# Altium footprint library FCI THD.PcbLib: 30 footprints (part 1 of 2)
Each footprint in its own frame and in the unit in brackets; x right, y up, seen from the top. Pads: shape width x height; smd on the part's side, far side on the other; paste and mask are expansions set on the pad; w line width, h text height; cw(c..) or ccw(c..) is an arc to the next point about the centre after c.
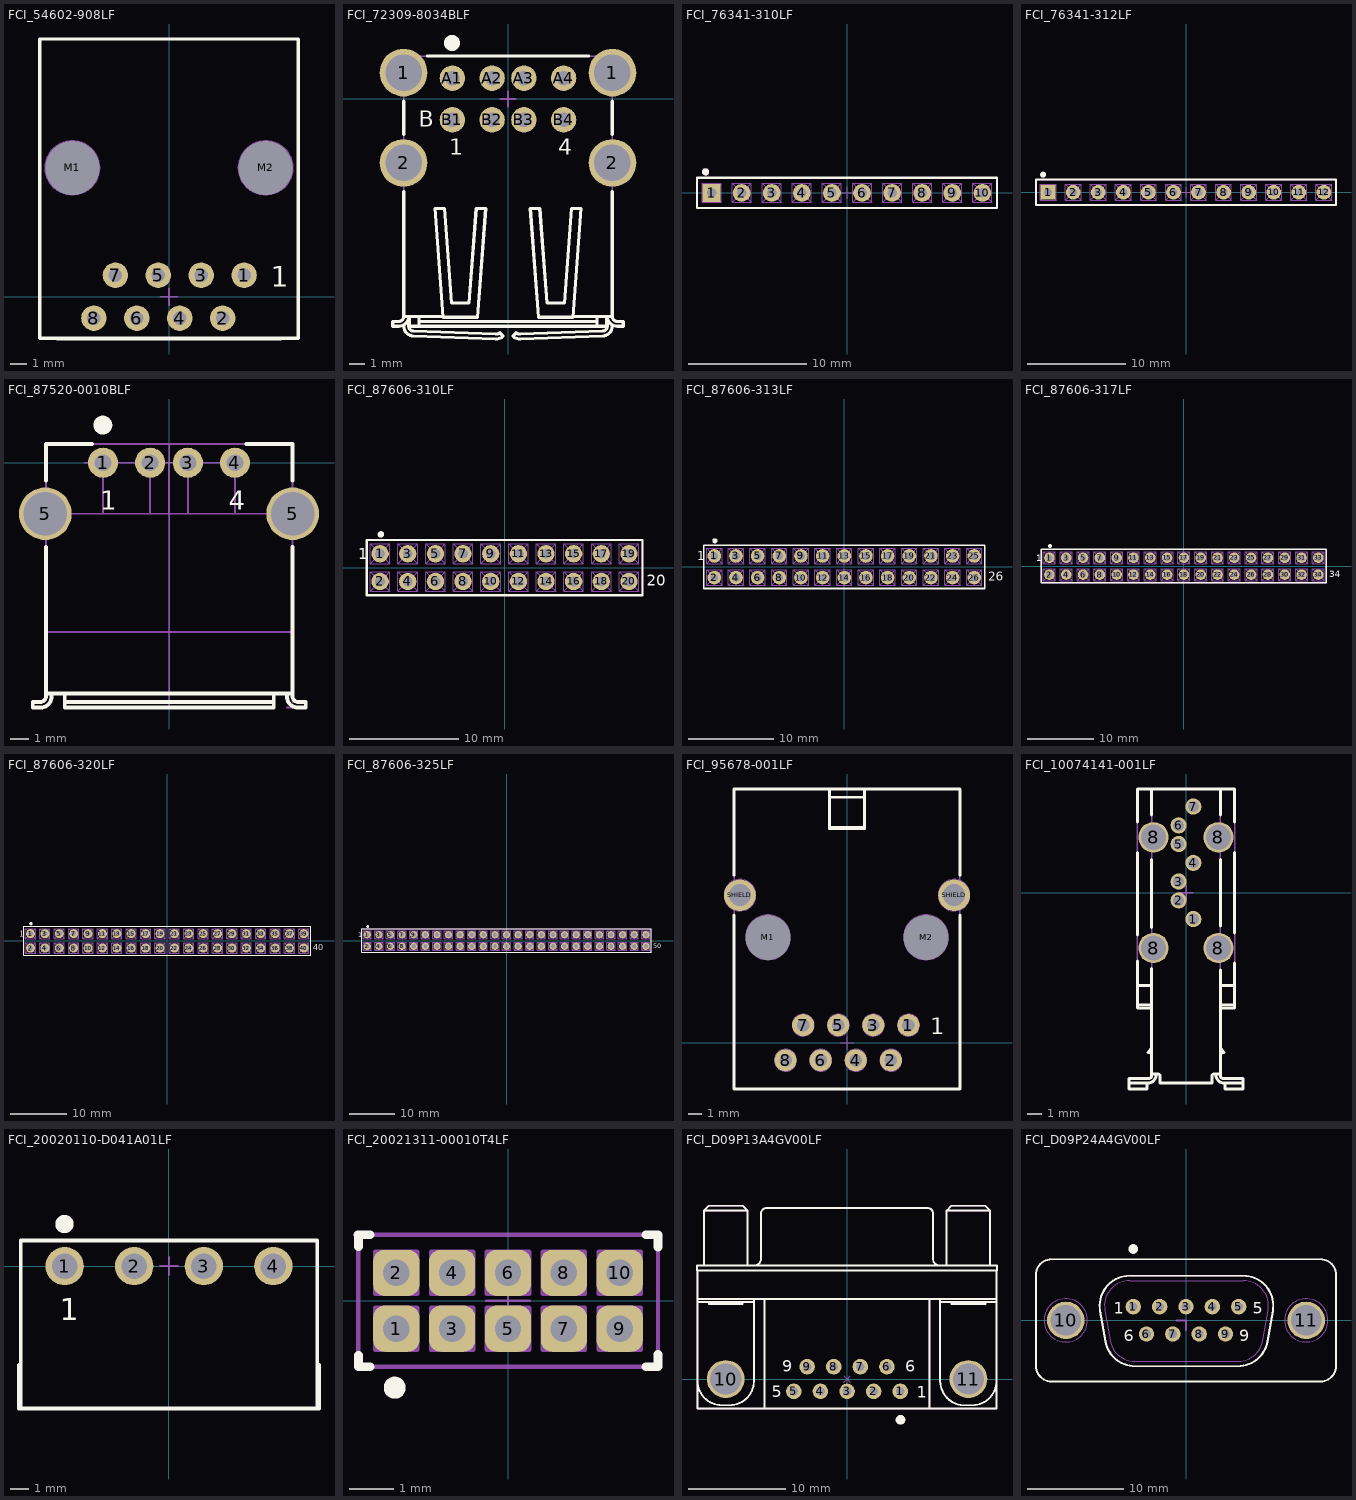
[diagram p0: the footprints below, top view; thin cyan lines are the x and y axes]

## FCI_54602-908LF [mm] "1 Port, 8 Positions, CAT3 RJ45 Horizontal Modular Jack"
height 10
pads (10):
  round 1.5 hole 0.8: 1(4.445,1.27) 2(3.175,-1.27) 3(1.905,1.27) 4(0.635,-1.27) 5(-0.635,1.27) 6(-1.905,-1.27) 7(-3.171,1.27) 8(-4.445,-1.27)
  round 1 hole 3.2 unplated mask+1.1: M1(-5.715,7.62) M2(5.715,7.62)
Top Overlay:
  lines w0.2: -6.6,-2.46 -6.6,-2.5 6.6,-2.5 6.6,-2.46 ; -7.65,-2.46 7.65,-2.46 7.65,15.24 -7.65,15.24 -7.65,-2.46
  text "1" at 6.03,0.6 h1.2
Mechanical 8:
  circle w0.1: c5.715,7.62 r1.6
  circle w0.1: c-5.715,7.62 r1.6
  circle w0.1: c4.445,1.27 r0.415
  circle w0.1: c-3.175,1.27 r0.415
  circle w0.1: c-4.445,-1.27 r0.415
  circle w0.1: c3.175,-1.27 r0.415
  lines w0.1: -6.215,7.62 -5.715,7.62 ; -5.715,7.12 -5.715,7.62 ; -5.715,8.12 -5.715,7.62 ; -5.215,7.62 -5.715,7.62 ; -4.945,-1.27 -4.445,-1.27 ; -4.445,-1.77 -4.445,-1.27 ; -4.445,-0.77 -4.445,-1.27 ; -3.945,-1.27 -4.445,-1.27 ; -3.675,1.27 -3.175,1.27 ; -3.175,0.77 -3.175,1.27 ; -3.175,1.77 -3.175,1.27 ; -2.675,1.27 -3.175,1.27 ; -2.405,-1.27 -1.905,-1.27 ; -1.905,-1.77 -1.905,-1.27 ; -1.905,-0.77 -1.905,-1.27 ; -1.405,-1.27 -1.905,-1.27 ; -1.135,1.27 -0.635,1.27 ; -0.635,0.77 -0.635,1.27 ; -0.635,1.77 -0.635,1.27 ; -0.5,0 0,0 ; -0.135,1.27 -0.635,1.27 ; 0,-0.5 0,0 ; 0,0.5 0,0 ; 0.135,-1.27 0.635,-1.27 ; 0.5,0 0,0 ; 0.635,-1.77 0.635,-1.27 ; 0.635,-0.77 0.635,-1.27 ; 1.135,-1.27 0.635,-1.27 ; 1.405,1.27 1.905,1.27 ; 1.905,0.77 1.905,1.27 ; 1.905,1.77 1.905,1.27 ; 2.405,1.27 1.905,1.27 ; 2.675,-1.27 3.175,-1.27 ; 3.175,-1.77 3.175,-1.27 ; 3.175,-0.77 3.175,-1.27 ; 3.675,-1.27 3.175,-1.27 ; 3.945,1.27 4.445,1.27 ; 4.445,0.77 4.445,1.27 ; 4.445,1.77 4.445,1.27 ; 4.945,1.27 4.445,1.27 ; 5.215,7.62 5.715,7.62 ; 5.715,7.12 5.715,7.62 ; 5.715,8.12 5.715,7.62 ; 6.215,7.62 5.715,7.62
Mechanical 14:
  lines w0.1: -6.6,-2.46 -6.6,-2.5 6.6,-2.5 6.6,-2.46 ; -7.65,-2.46 7.65,-2.46 7.65,15.24 -7.65,15.24 -7.65,-2.46
  text "1" at 6.03,0.6 h1.2
3D body "FCI_54602-908LF.stp": height 12.7, standoff -3.5, extent -7.65,-2.5 7.65,15.24

## FCI_72309-8034BLF [mm] "Dual USB Type A 4 Pin Receptacle, Right Angle, Shielded"
height 15.5
pads (12):
  round 3 hole 2.3: 1(-6.57,1.66) 1(6.57,1.66) 2(-6.57,-4.02) 2(6.57,-4.02)
  round 1.6 hole 0.9: A1(-3.5,1.31) A2(-1,1.31) A3(1,1.31) A4(3.5,1.31) B1(-3.5,-1.31) B2(-1,-1.31) B3(1,-1.31) B4(3.5,-1.31)
Top Overlay:
  circle w0.5: c-3.525,3.525 r0.25
  lines w0.2: -6.555,-14.214 -6.555,-14.3 ccw(c-5.95,-14.3) -5.973,-14.905 -0.78,-15.1 ccw(c-0.755,-14.433) -0.305,-14.925 -0.511,-14.7 cw(c-0.755,-14.433) -0.769,-14.795 -5.961,-14.6 cw(c-5.95,-14.3) -6.25,-14.3 -6.25,-13.68 cw(c-6.87,-13.68) -6.87,-14.3 -7.25,-14.301 -7.25,-13.995 -6.87,-13.995 ccw(c-6.87,-13.68) -6.555,-13.68 ; -6.555,-5.82 -6.555,-13.68 ; -6.555,-2.22 -6.555,-0.14 ; -6.2,-13.68 -6.2,-14.3 6.2,-14.3 6.2,-13.68 ; -5.6,-14.3 -5.6,-13.68 ; -5.6,-13.995 5.6,-13.995 ; -5.102,2.701 5.086,2.7 ; -4.094,-13.68 -6.555,-13.68 ; -4.085,-13.724 -4.602,-6.88 -4,-6.88 -3.55,-12.84 -2.45,-12.84 -2,-6.88 -1.398,-6.88 -1.915,-13.73 -4.085,-13.73 ; 0.755,-14.795 5.961,-14.6 ccw(c5.95,-14.3) 6.25,-14.3 6.25,-13.68 ccw(c6.87,-13.68) 6.87,-14.3 7.25,-14.3 7.25,-13.995 6.87,-13.995 cw(c6.87,-13.68) 6.555,-13.68 ; 0.769,-14.795 cw(c0.755,-14.433) 0.511,-14.7 0.305,-14.925 ccw(c0.755,-14.433) 0.78,-15.1 5.973,-14.905 ccw(c5.95,-14.3) 6.555,-14.3 6.555,-14.214 ; 1.915,-13.73 4.085,-13.73 4.602,-6.88 4,-6.88 3.55,-12.84 2.45,-12.84 2,-6.88 1.398,-6.88 1.915,-13.724 ; 4.088,-13.68 6.555,-13.68 ; 5.6,-14.3 5.6,-13.68 ; 6.555,-5.82 6.555,-13.68 ; 6.555,-2.22 6.555,-0.14
  text "4" at 3.148,-3.5 h1
  text "1" at -3.685,-3.5 h1
  text "B" at -5.613,-1.75 h1
Mechanical 8:
  lines w0.1: -7.07,-4.02 -6.57,-4.02 ; -7.07,1.66 -6.57,1.66 ; -6.57,-4.52 -6.57,-4.02 ; -6.57,-3.52 -6.57,-4.02 ; -6.57,1.16 -6.57,1.66 ; -6.57,2.16 -6.57,1.66 ; -6.07,-4.02 -6.57,-4.02 ; -6.07,1.66 -6.57,1.66 ; -4,-1.31 -3.5,-1.31 ; -4,1.31 -3.5,1.31 ; -3.5,-1.81 -3.5,-1.31 ; -3.5,-0.81 -3.5,-1.31 ; -3.5,0.81 -3.5,1.31 ; -3.5,1.81 -3.5,1.31 ; -3,-1.31 -3.5,-1.31 ; -3,1.31 -3.5,1.31 ; -1.5,-1.31 -1,-1.31 ; -1.5,1.31 -1,1.31 ; -1,-1.81 -1,-1.31 ; -1,-0.81 -1,-1.31 ; -1,0.81 -1,1.31 ; -1,1.81 -1,1.31 ; -0.5,-1.31 -1,-1.31 ; -0.5,0 0,0 ; -0.5,1.31 -1,1.31 ; 0,-0.5 0,0 ; 0,0.5 0,0 ; 0.5,-1.31 1,-1.31 ; 0.5,0 0,0 ; 0.5,1.31 1,1.31 ; 1,-1.81 1,-1.31 ; 1,-0.81 1,-1.31 ; 1,0.81 1,1.31 ; 1,1.81 1,1.31 ; 1.5,-1.31 1,-1.31 ; 1.5,1.31 1,1.31 ; 3,-1.31 3.5,-1.31 ; 3,1.31 3.5,1.31 ; 3.5,-1.81 3.5,-1.31 ; 3.5,-0.81 3.5,-1.31 ; 3.5,0.81 3.5,1.31 ; 3.5,1.81 3.5,1.31 ; 4,-1.31 3.5,-1.31 ; 4,1.31 3.5,1.31 ; 6.07,-4.02 6.57,-4.02 ; 6.07,1.66 6.57,1.66 ; 6.57,-4.52 6.57,-4.02 ; 6.57,-3.52 6.57,-4.02 ; 6.57,1.16 6.57,1.66 ; 6.57,2.16 6.57,1.66 ; 7.07,-4.02 6.57,-4.02 ; 7.07,1.66 6.57,1.66
Mechanical 14:
  lines w0.1: -6.555,-14.214 -6.555,-14.3 ccw(c-5.95,-14.3) -5.973,-14.905 -0.78,-15.1 ccw(c-0.755,-14.433) -0.305,-14.925 -0.511,-14.7 cw(c-0.755,-14.433) -0.769,-14.795 -5.961,-14.6 cw(c-5.95,-14.3) -6.25,-14.3 -6.25,-13.68 cw(c-6.87,-13.68) -6.87,-14.3 -7.25,-14.301 -7.25,-13.995 -6.87,-13.995 ccw(c-6.87,-13.68) -6.555,-13.68 ; -6.555,1 -7.5,1 -7.5,2 -6.555,2 ; -6.555,2.701 6.555,2.7 ; -6.25,2.7 -6.25,2.918 -6.555,2.918 -6.555,-13.68 ; -6.2,-13.68 -6.2,-14.3 6.2,-14.3 6.2,-13.68 ; -5.6,-14.3 -5.6,-13.68 ; -5.6,-13.995 5.6,-13.995 ; -4.094,-13.68 -6.555,-13.68 ; -4.085,-13.724 -4.602,-6.88 -4,-6.88 -3.55,-12.84 -2.45,-12.84 -2,-6.88 -1.398,-6.88 -1.915,-13.73 -4.085,-13.73 ; 0.755,-14.795 5.961,-14.6 ccw(c5.95,-14.3) 6.25,-14.3 6.25,-13.68 ccw(c6.87,-13.68) 6.87,-14.3 7.25,-14.3 7.25,-13.995 6.87,-13.995 cw(c6.87,-13.68) 6.555,-13.68 ; 0.769,-14.795 cw(c0.755,-14.433) 0.511,-14.7 0.305,-14.925 ccw(c0.755,-14.433) 0.78,-15.1 5.973,-14.905 ccw(c5.95,-14.3) 6.555,-14.3 6.555,-14.214 ; 1.915,-13.73 4.085,-13.73 4.602,-6.88 4,-6.88 3.55,-12.84 2.45,-12.84 2,-6.88 1.398,-6.88 1.915,-13.724 ; 4.088,-13.68 6.555,-13.68 ; 5.6,-14.3 5.6,-13.68 ; 6.25,2.7 6.25,2.918 6.555,2.918 6.555,-13.68 ; 6.555,1 7.5,1 7.5,2 6.555,2
  text "4" at 3.148,-3.5 h1
  text "1" at -3.685,-3.5 h1
  text "B" at -5.613,-1.75 h1
3D body "FCI_72309-8034BLF.stp": height 16.19, standoff -2.8, extent -7.5,-15.099 7.5,2.918

## FCI_76341-310LF [mm] "2.54mm (.100\") Pitch, 10 Circuits  Single Row  Top Entry Through Mount Receptacle"
height 7
pads (10):
  rect 1.5x1.5 hole 0.8: 1(-11.43,0)
  round 1.5 hole 0.8: 2(-8.89,0) 3(-6.35,0) 4(-3.81,0) 5(-1.27,0) 6(1.27,0) 7(3.81,0) 8(6.35,0) 9(8.89,0) 10(11.43,0)
Top Overlay:
  circle w0.3: c-11.938,1.778 r0.15
  lines w0.2: -12.66,-1.27 12.66,-1.27 12.66,1.27 -12.66,1.27 -12.66,-1.27
Mechanical 8:
  lines w0.1: -11.93,0 -11.43,0 ; -11.43,-0.5 -11.43,0 ; -11.43,0.5 -11.43,0 ; -10.93,0 -11.43,0 ; -9.39,0 -8.89,0 ; -8.89,-0.5 -8.89,0 ; -8.89,0.5 -8.89,0 ; -8.39,0 -8.89,0 ; -6.85,0 -6.35,0 ; -6.35,-0.5 -6.35,0 ; -6.35,0.5 -6.35,0 ; -5.85,0 -6.35,0 ; -4.31,0 -3.81,0 ; -3.81,-0.5 -3.81,0 ; -3.81,0.5 -3.81,0 ; -3.31,0 -3.81,0 ; -1.77,0 -1.27,0 ; -1.27,-0.5 -1.27,0 ; -1.27,0.5 -1.27,0 ; -0.77,0 -1.27,0 ; -0.5,0 0,0 ; 0,-0.5 0,0 ; 0,0.5 0,0 ; 0.5,0 0,0 ; 0.77,0 1.27,0 ; 1.27,-0.5 1.27,0 ; 1.27,0.5 1.27,0 ; 1.77,0 1.27,0 ; 3.31,0 3.81,0 ; 3.81,-0.5 3.81,0 ; 3.81,0.5 3.81,0 ; 4.31,0 3.81,0 ; 5.85,0 6.35,0 ; 6.35,-0.5 6.35,0 ; 6.35,0.5 6.35,0 ; 6.85,0 6.35,0 ; 8.39,0 8.89,0 ; 8.89,-0.5 8.89,0 ; 8.89,0.5 8.89,0 ; 9.39,0 8.89,0 ; 10.93,0 11.43,0 ; 11.43,-0.5 11.43,0 ; 11.43,0.5 11.43,0 ; 11.93,0 11.43,0
Mechanical 14:
  circle w0.3: c-11.938,1.778 r0.15
  lines w0.1: -12.23,-0.8 -11.93,-0.5 ; -12.23,-0.8 -12.23,0.8 ; -12.23,-0.8 -10.63,-0.8 ; -12.23,0.8 -11.93,0.5 ; -12.23,0.8 -10.63,0.8 ; -11.93,-0.5 -11.93,0.5 ; -11.93,-0.5 -10.93,-0.5 ; -11.93,0.5 -10.93,0.5 ; -10.93,-0.5 -10.63,-0.8 ; -10.93,-0.5 -10.93,0.5 ; -10.93,0.5 -10.63,0.8 ; -10.63,-0.8 -10.63,0.8 ; -9.69,-0.8 -9.39,-0.5 ; -9.69,-0.8 -9.69,0.8 ; -9.69,-0.8 -8.09,-0.8 ; -9.69,0.8 -9.39,0.5 ; -9.69,0.8 -8.09,0.8 ; -9.39,-0.5 -9.39,0.5 ; -9.39,-0.5 -8.39,-0.5 ; -9.39,0.5 -8.39,0.5 ; -8.39,-0.5 -8.09,-0.8 ; -8.39,-0.5 -8.39,0.5 ; -8.39,0.5 -8.09,0.8 ; -8.09,-0.8 -8.09,0.8 ; -7.15,-0.8 -6.85,-0.5 ; -7.15,-0.8 -7.15,0.8 ; -7.15,-0.8 -5.55,-0.8 ; -7.15,0.8 -6.85,0.5 ; -7.15,0.8 -5.55,0.8 ; -6.85,-0.5 -6.85,0.5 ; -6.85,-0.5 -5.85,-0.5 ; -6.85,0.5 -5.85,0.5 ; -5.85,-0.5 -5.55,-0.8 ; -5.85,-0.5 -5.85,0.5 ; -5.85,0.5 -5.55,0.8 ; -5.55,-0.8 -5.55,0.8 ; -4.61,-0.8 -4.31,-0.5 ; -4.61,-0.8 -4.61,0.8 ; -4.61,-0.8 -3.01,-0.8 ; -4.61,0.8 -4.31,0.5 ; -4.61,0.8 -3.01,0.8 ; -4.31,-0.5 -4.31,0.5 ; -4.31,-0.5 -3.31,-0.5 ; -4.31,0.5 -3.31,0.5 ; -3.31,-0.5 -3.01,-0.8 ; -3.31,-0.5 -3.31,0.5 ; -3.31,0.5 -3.01,0.8 ; -3.01,-0.8 -3.01,0.8 ; -2.07,-0.8 -1.77,-0.5 ; -2.07,-0.8 -2.07,0.8 ; -2.07,-0.8 -0.47,-0.8 ; -2.07,0.8 -1.77,0.5 ; -2.07,0.8 -0.47,0.8 ; -1.77,-0.5 -1.77,0.5 ; -1.77,-0.5 -0.77,-0.5 ; -1.77,0.5 -0.77,0.5 ; -0.77,-0.5 -0.47,-0.8 ; -0.77,-0.5 -0.77,0.5 ; -0.77,0.5 -0.47,0.8 ; -0.47,-0.8 -0.47,0.8 ; 0.47,-0.8 0.77,-0.5 ; 0.47,-0.8 0.47,0.8 ; 0.47,-0.8 2.07,-0.8 ; 0.47,0.8 0.77,0.5 ; 0.47,0.8 2.07,0.8 ; 0.77,-0.5 0.77,0.5 ; 0.77,-0.5 1.77,-0.5 ; 0.77,0.5 1.77,0.5 ; 1.77,-0.5 2.07,-0.8 ; 1.77,-0.5 1.77,0.5 ; 1.77,0.5 2.07,0.8 ; 2.07,-0.8 2.07,0.8 ; 3.01,-0.8 3.31,-0.5 ; 3.01,-0.8 3.01,0.8 ; 3.01,-0.8 4.61,-0.8 ; 3.01,0.8 3.31,0.5 ; 3.01,0.8 4.61,0.8 ; 3.31,-0.5 3.31,0.5 ; 3.31,-0.5 4.31,-0.5 ; 3.31,0.5 4.31,0.5 ; 4.31,-0.5 4.61,-0.8 ; 4.31,-0.5 4.31,0.5 ; 4.31,0.5 4.61,0.8 ; 4.61,-0.8 4.61,0.8 ; 5.55,-0.8 5.85,-0.5 ; 5.55,-0.8 5.55,0.8 ; 5.55,-0.8 7.15,-0.8 ; 5.55,0.8 5.85,0.5 ; 5.55,0.8 7.15,0.8 ; 5.85,-0.5 5.85,0.5 ; 5.85,-0.5 6.85,-0.5 ; 5.85,0.5 6.85,0.5 ; 6.85,-0.5 7.15,-0.8 ; 6.85,-0.5 6.85,0.5 ; 6.85,0.5 7.15,0.8 ; 7.15,-0.8 7.15,0.8 ; 8.09,-0.8 8.39,-0.5 ; 8.09,-0.8 8.09,0.8 ; 8.09,-0.8 9.69,-0.8 ; 8.09,0.8 8.39,0.5 ; 8.09,0.8 9.69,0.8 ; 8.39,-0.5 8.39,0.5 ; 8.39,-0.5 9.39,-0.5 ; 8.39,0.5 9.39,0.5 ; 9.39,-0.5 9.69,-0.8 ; 9.39,-0.5 9.39,0.5 ; 9.39,0.5 9.69,0.8 ; 9.69,-0.8 9.69,0.8 ; 10.63,-0.8 10.93,-0.5 ; 10.63,-0.8 10.63,0.8 ; 10.63,-0.8 12.23,-0.8 ; 10.63,0.8 10.93,0.5 ; 10.63,0.8 12.23,0.8 ; 10.93,-0.5 10.93,0.5 ; 10.93,-0.5 11.93,-0.5 ; 10.93,0.5 11.93,0.5 ; 11.93,-0.5 12.23,-0.8 ; 11.93,-0.5 11.93,0.5 ; 11.93,0.5 12.23,0.8 ; 12.23,-0.8 12.23,0.8 ; -12.66,-1.27 12.66,-1.27 12.66,1.27 -12.66,1.27 -12.66,-1.27
3D body "FCI_76341-310LF.stp": height 7, standoff -2.96, extent -12.66,-1.27 12.66,1.27

## FCI_76341-312LF [mm] "2.54mm (.100\") Pitch, 12 Circuits  Single Row  Top Entry Through Mount Receptacle"
height 7
pads (12):
  rect 1.5x1.5 hole 0.8: 1(-13.97,0)
  round 1.5 hole 0.8: 2(-11.43,0) 3(-8.89,0) 4(-6.35,0) 5(-3.81,0) 6(-1.27,0) 7(1.27,0) 8(3.81,0) 9(6.35,0) 10(8.89,0) 11(11.43,0) 12(13.97,0)
Top Overlay:
  circle w0.3: c-14.478,1.778 r0.15
  lines w0.2: -15.2,-1.27 -15.2,1.27 15.2,1.27 15.2,-1.27 -15.2,-1.27
Mechanical 8:
  lines w0.1: -14.47,0 -13.97,0 ; -13.97,-0.5 -13.97,0 ; -13.97,0.5 -13.97,0 ; -13.47,0 -13.97,0 ; -11.93,0 -11.43,0 ; -11.43,-0.5 -11.43,0 ; -11.43,0.5 -11.43,0 ; -10.93,0 -11.43,0 ; -9.39,0 -8.89,0 ; -8.89,-0.5 -8.89,0 ; -8.89,0.5 -8.89,0 ; -8.39,0 -8.89,0 ; -6.85,0 -6.35,0 ; -6.35,-0.5 -6.35,0 ; -6.35,0.5 -6.35,0 ; -5.85,0 -6.35,0 ; -4.31,0 -3.81,0 ; -3.81,-0.5 -3.81,0 ; -3.81,0.5 -3.81,0 ; -3.31,0 -3.81,0 ; -1.77,0 -1.27,0 ; -1.27,-0.5 -1.27,0 ; -1.27,0.5 -1.27,0 ; -0.77,0 -1.27,0 ; -0.5,0 0,0 ; 0,-0.5 0,0 ; 0,0.5 0,0 ; 0.5,0 0,0 ; 0.77,0 1.27,0 ; 1.27,-0.5 1.27,0 ; 1.27,0.5 1.27,0 ; 1.77,0 1.27,0 ; 3.31,0 3.81,0 ; 3.81,-0.5 3.81,0 ; 3.81,0.5 3.81,0 ; 4.31,0 3.81,0 ; 5.85,0 6.35,0 ; 6.35,-0.5 6.35,0 ; 6.35,0.5 6.35,0 ; 6.85,0 6.35,0 ; 8.39,0 8.89,0 ; 8.89,-0.5 8.89,0 ; 8.89,0.5 8.89,0 ; 9.39,0 8.89,0 ; 10.93,0 11.43,0 ; 11.43,-0.5 11.43,0 ; 11.43,0.5 11.43,0 ; 11.93,0 11.43,0 ; 13.47,0 13.97,0 ; 13.97,-0.5 13.97,0 ; 13.97,0.5 13.97,0 ; 14.47,0 13.97,0
Mechanical 14:
  circle w0.3: c-14.478,1.778 r0.15
  lines w0.1: -14.77,-0.8 -13.17,-0.8 ; -14.77,-0.8 -14.77,0.8 ; -14.77,-0.8 -14.47,-0.5 ; -14.77,0.8 -13.17,0.8 ; -14.77,0.8 -14.47,0.5 ; -14.47,-0.5 -14.47,0.5 ; -14.47,-0.5 -13.47,-0.5 ; -14.47,0.5 -13.47,0.5 ; -13.47,-0.5 -13.17,-0.8 ; -13.47,-0.5 -13.47,0.5 ; -13.47,0.5 -13.17,0.8 ; -13.17,-0.8 -13.17,0.8 ; -12.23,-0.8 -10.63,-0.8 ; -12.23,-0.8 -12.23,0.8 ; -12.23,-0.8 -11.93,-0.5 ; -12.23,0.8 -10.63,0.8 ; -12.23,0.8 -11.93,0.5 ; -11.93,-0.5 -11.93,0.5 ; -11.93,-0.5 -10.93,-0.5 ; -11.93,0.5 -10.93,0.5 ; -10.93,-0.5 -10.63,-0.8 ; -10.93,-0.5 -10.93,0.5 ; -10.93,0.5 -10.63,0.8 ; -10.63,-0.8 -10.63,0.8 ; -9.69,-0.8 -8.09,-0.8 ; -9.69,-0.8 -9.69,0.8 ; -9.69,-0.8 -9.39,-0.5 ; -9.69,0.8 -8.09,0.8 ; -9.69,0.8 -9.39,0.5 ; -9.39,-0.5 -9.39,0.5 ; -9.39,-0.5 -8.39,-0.5 ; -9.39,0.5 -8.39,0.5 ; -8.39,-0.5 -8.09,-0.8 ; -8.39,-0.5 -8.39,0.5 ; -8.39,0.5 -8.09,0.8 ; -8.09,-0.8 -8.09,0.8 ; -7.15,-0.8 -5.55,-0.8 ; -7.15,-0.8 -7.15,0.8 ; -7.15,-0.8 -6.85,-0.5 ; -7.15,0.8 -5.55,0.8 ; -7.15,0.8 -6.85,0.5 ; -6.85,-0.5 -6.85,0.5 ; -6.85,-0.5 -5.85,-0.5 ; -6.85,0.5 -5.85,0.5 ; -5.85,-0.5 -5.55,-0.8 ; -5.85,-0.5 -5.85,0.5 ; -5.85,0.5 -5.55,0.8 ; -5.55,-0.8 -5.55,0.8 ; -4.61,-0.8 -3.01,-0.8 ; -4.61,-0.8 -4.61,0.8 ; -4.61,-0.8 -4.31,-0.5 ; -4.61,0.8 -3.01,0.8 ; -4.61,0.8 -4.31,0.5 ; -4.31,-0.5 -4.31,0.5 ; -4.31,-0.5 -3.31,-0.5 ; -4.31,0.5 -3.31,0.5 ; -3.31,-0.5 -3.01,-0.8 ; -3.31,-0.5 -3.31,0.5 ; -3.31,0.5 -3.01,0.8 ; -3.01,-0.8 -3.01,0.8 ; -2.07,-0.8 -0.47,-0.8 ; -2.07,-0.8 -2.07,0.8 ; -2.07,-0.8 -1.77,-0.5 ; -2.07,0.8 -0.47,0.8 ; -2.07,0.8 -1.77,0.5 ; -1.77,-0.5 -1.77,0.5 ; -1.77,-0.5 -0.77,-0.5 ; -1.77,0.5 -0.77,0.5 ; -0.77,-0.5 -0.47,-0.8 ; -0.77,-0.5 -0.77,0.5 ; -0.77,0.5 -0.47,0.8 ; -0.47,-0.8 -0.47,0.8 ; 0.47,-0.8 2.07,-0.8 ; 0.47,-0.8 0.47,0.8 ; 0.47,-0.8 0.77,-0.5 ; 0.47,0.8 2.07,0.8 ; 0.47,0.8 0.77,0.5 ; 0.77,-0.5 0.77,0.5 ; 0.77,-0.5 1.77,-0.5 ; 0.77,0.5 1.77,0.5 ; 1.77,-0.5 2.07,-0.8 ; 1.77,-0.5 1.77,0.5 ; 1.77,0.5 2.07,0.8 ; 2.07,-0.8 2.07,0.8 ; 3.01,-0.8 4.61,-0.8 ; 3.01,-0.8 3.01,0.8 ; 3.01,-0.8 3.31,-0.5 ; 3.01,0.8 4.61,0.8 ; 3.01,0.8 3.31,0.5 ; 3.31,-0.5 3.31,0.5 ; 3.31,-0.5 4.31,-0.5 ; 3.31,0.5 4.31,0.5 ; 4.31,-0.5 4.61,-0.8 ; 4.31,-0.5 4.31,0.5 ; 4.31,0.5 4.61,0.8 ; 4.61,-0.8 4.61,0.8 ; 5.55,-0.8 7.15,-0.8 ; 5.55,-0.8 5.55,0.8 ; 5.55,-0.8 5.85,-0.5 ; 5.55,0.8 7.15,0.8 ; 5.55,0.8 5.85,0.5 ; 5.85,-0.5 5.85,0.5 ; 5.85,-0.5 6.85,-0.5 ; 5.85,0.5 6.85,0.5 ; 6.85,-0.5 7.15,-0.8 ; 6.85,-0.5 6.85,0.5 ; 6.85,0.5 7.15,0.8 ; 7.15,-0.8 7.15,0.8 ; 8.09,-0.8 9.69,-0.8 ; 8.09,-0.8 8.09,0.8 ; 8.09,-0.8 8.39,-0.5 ; 8.09,0.8 9.69,0.8 ; 8.09,0.8 8.39,0.5 ; 8.39,-0.5 8.39,0.5 ; 8.39,-0.5 9.39,-0.5 ; 8.39,0.5 9.39,0.5 ; 9.39,-0.5 9.69,-0.8 ; 9.39,-0.5 9.39,0.5 ; 9.39,0.5 9.69,0.8 ; 9.69,-0.8 9.69,0.8 ; 10.63,-0.8 12.23,-0.8 ; 10.63,-0.8 10.63,0.8 ; 10.63,-0.8 10.93,-0.5 ; 10.63,0.8 12.23,0.8 ; 10.63,0.8 10.93,0.5 ; 10.93,-0.5 10.93,0.5 ; 10.93,-0.5 11.93,-0.5 ; 10.93,0.5 11.93,0.5 ; 11.93,-0.5 12.23,-0.8 ; 11.93,-0.5 11.93,0.5 ; 11.93,0.5 12.23,0.8 ; 12.23,-0.8 12.23,0.8 ; 13.17,-0.8 14.77,-0.8 ; 13.17,-0.8 13.17,0.8 ; 13.17,-0.8 13.47,-0.5 ; 13.17,0.8 14.77,0.8 ; 13.17,0.8 13.47,0.5 ; 13.47,-0.5 13.47,0.5 ; 13.47,-0.5 14.47,-0.5 ; 13.47,0.5 14.47,0.5 ; 14.47,-0.5 14.77,-0.8 ; 14.47,-0.5 14.47,0.5 ; 14.47,0.5 14.77,0.8 ; 14.77,-0.8 14.77,0.8 ; -15.2,-1.27 -15.2,1.27 15.2,1.27 15.2,-1.27 -15.2,-1.27
3D body "FCI_76341-312LF.stp": height 7, standoff -2.96, extent -15.2,-1.27 15.2,1.27

## FCI_87520-0010BLF [mm] "USB 2.0 Type A Receptacle, 4 Pins, Right Angle, Shielded"
height 7.7
pads (6):
  round 1.6 hole 0.9: 1(-3.5,0) 2(-1,0) 3(1,0) 4(3.5,0)
  round 2.8 hole 2.3: 5(-6.57,-2.71) 5(6.57,-2.71)
Top Overlay:
  circle w0.5: c-3.515,2 r0.25
  lines w0.2: -6.537,-12.26 6.563,-12.26 ; -6.537,-4.46 -6.537,-12.41 cw(c-6.837,-12.41) -6.837,-12.71 -7.237,-12.71 -7.237,-13.01 -6.837,-13.01 ccw(c-6.837,-12.41) -6.237,-12.41 -6.237,-12.26 ; -6.537,-0.96 -6.537,0.99 -4.075,0.99 ; -5.537,-12.71 5.563,-12.71 ; -5.537,-12.26 -5.537,-13.01 5.563,-13.01 5.563,-12.26 ; 4.101,0.99 6.563,0.99 6.563,-0.96 ; 6.263,-12.26 6.263,-12.41 ccw(c6.863,-12.41) 6.863,-13.01 7.263,-13.01 7.263,-12.71 6.863,-12.71 cw(c6.863,-12.41) 6.563,-12.41 6.563,-4.46
  text "1" at -3.66,-2.5 h1
  text "4" at 3.173,-2.5 h1
Mechanical 8:
  circle w0.1: c6.57,-2.71 r1.15
  circle w0.1: c3.487,0 r0.5
  circle w0.1: c-3.5,0 r0.5
  circle w0.1: c1,0 r0.5
  circle w0.1: c-1.013,0 r0.5
  circle w0.1: c-6.57,-2.71 r1.15
  lines w0.1: -7.57,-2.71 -6.57,-2.71 ; -6.57,-3.71 -6.57,-2.71 ; -6.537,-9 6.563,-9 ; -4.5,0 -3.5,0 ; -3.5,-2.71 -3.5,0 ; -3.5,-1 -3.5,0 ; -2,0 -1,0 ; -1,-2.71 -1,0 ; -1,-1 -1,0 ; 0,-2.71 0,0 ; 0.013,-13.01 0.013,0.99 ; 0.013,0 1.013,0 1.013,-1 ; 1,-2.71 1,0 ; 2.5,0 3.5,0 ; 3.5,-2.71 3.5,0 ; 3.5,-1 3.5,0 ; 5.57,-2.71 6.57,-2.71 ; 6.263,-13.01 7.263,-13.01 ; 6.563,-12.71 7.263,-12.71 ; 6.57,-3.71 6.57,-2.71 ; -6.57,-2.71 6.57,-2.71 ; -3.5,0 3.5,0 ; -3.713,-0.15 -3.713,0.15 -3.313,0.15 -3.313,-0.15 -3.713,-0.15 ; -1.213,-0.15 -1.213,0.15 -0.813,0.15 -0.813,-0.15 -1.213,-0.15 ; 0.8,-0.15 0.8,0.15 1.2,0.15 1.2,-0.15 0.8,-0.15 ; 3.287,-0.15 3.287,0.15 3.687,0.15 3.687,-0.15 3.287,-0.15
Mechanical 14:
  lines w0.1: -6.537,-12.26 6.563,-12.26 ; -6.237,-12.26 -6.237,-12.41 cw(c-6.837,-12.41) -6.837,-13.01 -7.237,-13.01 -7.237,-12.71 -6.837,-12.71 ccw(c-6.837,-12.41) -6.537,-12.41 -6.537,0.99 6.563,0.99 6.563,-12.41 ccw(c6.863,-12.41) 6.863,-12.71 7.263,-12.71 7.263,-13.01 6.863,-13.01 cw(c6.863,-12.41) 6.263,-12.41 6.263,-12.26 ; -5.537,-12.71 5.563,-12.71 ; -5.537,-12.26 -5.537,-13.01 5.563,-13.01 5.563,-12.26
  text "1" at -3.66,-2.5 h1
  text "4" at 3.173,-2.5 h1
3D body "FCI_87520-0010BLF.stp": height 7.55, standoff -3.3, extent -7.9,-13.05 7.9,1.11
